# Altium footprint library LukaLIBRARY.PcbLib: 772 footprints (part 23 of 49)
Each footprint in its own frame and in the unit in brackets; x right, y up, seen from the top. Pads: shape width x height; smd on the part's side, far side on the other; paste and mask are expansions set on the pad; w line width, h text height; cw(c..) or ccw(c..) is an arc to the next point about the centre after c.
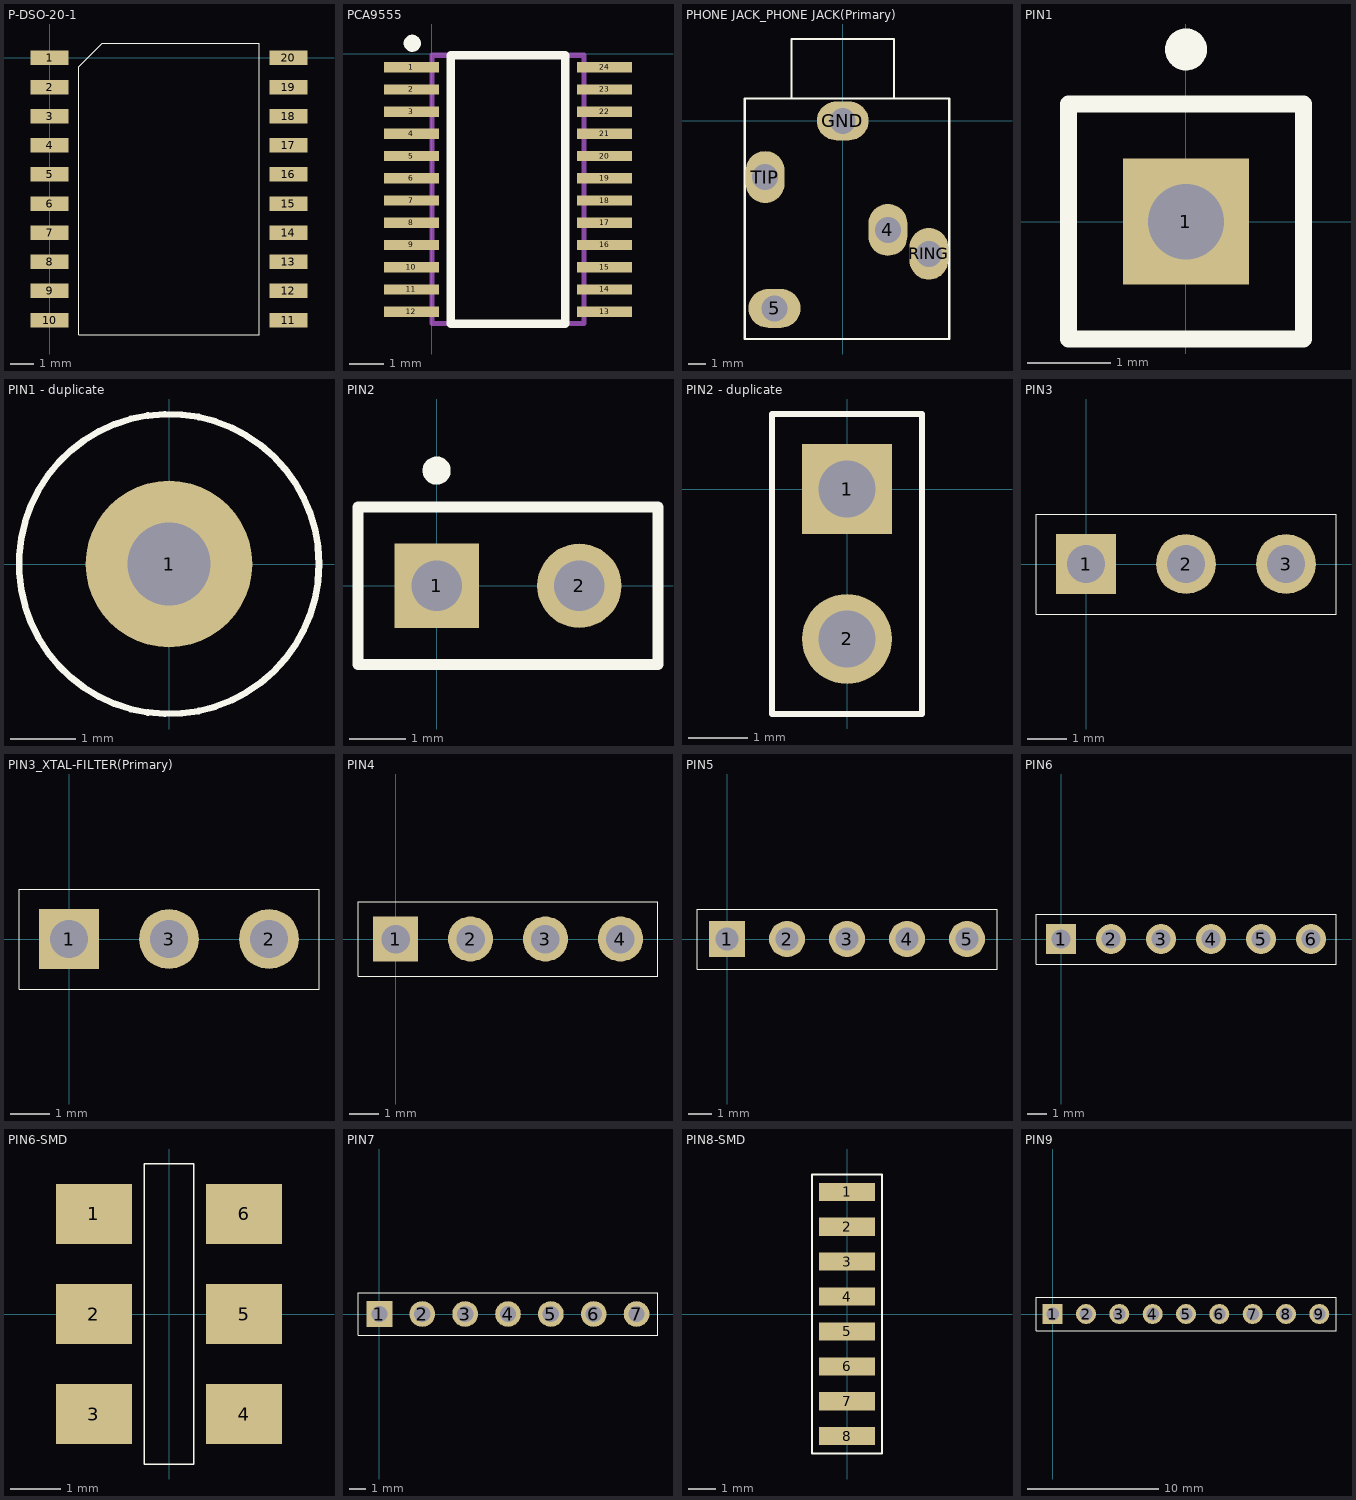
[diagram p22: the footprints below, top view; thin cyan lines are the x and y axes]

## P-DSO-20-1 [mil]
pads (20):
  rect 65x25 smd: 1(0,0) 2(0,-50) 3(0,-100) 4(0,-150) 5(0,-200) 6(0,-250) 7(0,-300) 8(0,-350) 9(0,-400) 10(0,-450) 11(410,-450) 12(410,-400) 13(410,-350) 14(410,-300) 15(410,-250) 16(410,-200) 17(410,-150) 18(410,-100) 19(410,-50) 20(410,0)
Top Overlay:
  lines w1: 50,-475 360,-475 360,25 90,25 50,-15 50,-475

## PCA9555 [mm] "I2C I/O Ports PW Package"
pads (24):
  rect 1.6x0.3 smd: 1(-0.6,-0.4) 2(-0.6,-1.05) 3(-0.6,-1.7) 4(-0.6,-2.35) 5(-0.6,-3) 6(-0.6,-3.65) 7(-0.6,-4.3) 8(-0.6,-4.95) 9(-0.6,-5.6) 10(-0.6,-6.25) 11(-0.6,-6.9) 12(-0.6,-7.55) 13(5.05,-7.55) 14(5.05,-6.9) 15(5.05,-6.25) 16(5.05,-5.6) 17(5.05,-4.95) 18(5.05,-4.3) 19(5.05,-3.65) 20(5.05,-3) 21(5.05,-2.35) 22(5.05,-1.7) 23(5.05,-1.05) 24(5.05,-0.4)
Top Overlay:
  circle w0.25: c-0.575,0.3 r0.125
  lines w0.254: 0.55,-7.9 0.55,-0.05 3.9,-0.05 3.9,-7.9 0.55,-7.9
Mechanical 1:
  lines w0.15: 0,-7.9 0,-0.05 4.45,-0.05 4.45,-7.9 0,-7.9

## PHONE JACK_PHONE JACK(Primary) [mil]
pads (5):
  oval 90x120 hole 60: 4(104.33,-251.97) RING(198.82,-307.09) TIP(-179.13,-129.92)
  oval 120x90 hole 60: 5(-157.48,-433.07) GND(0,0)
Top Overlay:
  lines w5: -118.11,51.18 -118.11,188.98 118.11,188.98 118.11,51.18 ; -226.38,-503.94 246.06,-503.94 246.06,51.18 -226.38,51.18 -226.38,-503.94

## PIN1 [mm] "Generic Antenna; 1 Lead"
pads (1):
  rect 1.5x1.5 hole 0.9: 1(0,0)
Top Overlay:
  circle w0.25: c0,2.05 r0.125
  lines w0.2: -1.4,-1.4 -1.4,1.4 1.4,1.4 1.4,-1.4 -1.4,-1.4

## PIN1 - duplicate [mm]
pads (1):
  round 2.54 hole 1.27 mask-25.4: 1(0,0)
Top Overlay:
  circle w0.1: c0,0 r2.286
Top Solder:
  region: 0,1.281 -0.332,1.237 -0.64,1.109 -0.906,0.906 -1.109,0.64 -1.237,0.332 -1.281,0 -1.237,-0.332 -1.109,-0.64 -0.906,-0.906 -0.64,-1.109 -0.332,-1.237 0,-1.281 0.332,-1.237 0.64,-1.109 0.906,-0.906 1.109,-0.64 1.237,-0.332 1.281,0 1.237,0.332 1.109,0.64 0.906,0.906 0.64,1.109 0.332,1.237
Bottom Solder:
  region: 0,1.281 -0.332,1.237 -0.64,1.109 -0.906,0.906 -1.109,0.64 -1.237,0.332 -1.281,0 -1.237,-0.332 -1.109,-0.64 -0.906,-0.906 -0.64,-1.109 -0.332,-1.237 0,-1.281 0.332,-1.237 0.64,-1.109 0.906,-0.906 1.109,-0.64 1.237,-0.332 1.281,0 1.237,0.332 1.109,0.64 0.906,0.906 0.64,1.109 0.332,1.237

## PIN2 [mm] "Photosensitive Diode; 2 Leads"
pads (2):
  rect 1.5x1.5 hole 0.9: 1(0,0)
  round 1.5 hole 0.9: 2(2.54,0)
Top Overlay:
  circle w0.25: c0,2.05 r0.125
  lines w0.2: -1.4,-1.4 -1.4,1.4 3.94,1.4 3.94,-1.4 -1.4,-1.4

## PIN2 - duplicate [mil]
pads (2):
  rect 60x60 hole 38 mask-1000: 1(0,0)
  round 60 hole 38 mask-1000: 2(0,-100)
Top Overlay:
  lines w3.94: -50,-150 -50,50 50,50 50,-150 -50,-150
Top Solder:
  region: 0,-69.74 -7.83,-70.77 -15.13,-73.8 -21.4,-78.6 -26.2,-84.87 -29.23,-92.17 -30.26,-100 -29.23,-107.83 -26.2,-115.13 -21.4,-121.4 -15.13,-126.2 -7.83,-129.23 0,-130.26 7.83,-129.23 15.13,-126.2 21.4,-121.4 26.2,-115.13 29.23,-107.83 30.26,-100 29.23,-92.17 26.2,-84.87 21.4,-78.6 15.13,-73.8 7.83,-70.77
  region: -30,-30 30,-30 30,30 -30,30
Bottom Solder:
  region: 0,-69.74 -7.83,-70.77 -15.13,-73.8 -21.4,-78.6 -26.2,-84.87 -29.23,-92.17 -30.26,-100 -29.23,-107.83 -26.2,-115.13 -21.4,-121.4 -15.13,-126.2 -7.83,-129.23 0,-130.26 7.83,-129.23 15.13,-126.2 21.4,-121.4 26.2,-115.13 29.23,-107.83 30.26,-100 29.23,-92.17 26.2,-84.87 21.4,-78.6 15.13,-73.8 7.83,-70.77
  region: -30,-30 30,-30 30,30 -30,30

## PIN3 [mil]
pads (3):
  rect 60x60 hole 38 mask-1000: 1(0,0)
  round 60 hole 38 mask-1000: 2(100,0) 3(200,0)
Top Overlay:
  lines w1: -50,-50 250,-50 250,50 -50,50 -50,-50
Top Solder:
  region: -30,-30 30,-30 30,30 -30,30
  region: 100,30.26 92.17,29.23 84.87,26.2 78.6,21.4 73.8,15.13 70.77,7.83 69.74,0 70.77,-7.83 73.8,-15.13 78.6,-21.4 84.87,-26.2 92.17,-29.23 100,-30.26 107.83,-29.23 115.13,-26.2 121.4,-21.4 126.2,-15.13 129.23,-7.83 130.26,0 129.23,7.83 126.2,15.13 121.4,21.4 115.13,26.2 107.83,29.23
  region: 200,30.26 192.17,29.23 184.87,26.2 178.6,21.4 173.79,15.13 170.77,7.83 169.74,0 170.77,-7.83 173.79,-15.13 178.6,-21.4 184.87,-26.2 192.17,-29.23 200,-30.26 207.83,-29.23 215.13,-26.2 221.4,-21.4 226.21,-15.13 229.23,-7.83 230.26,0 229.23,7.83 226.21,15.13 221.4,21.4 215.13,26.2 207.83,29.23
Bottom Solder:
  region: -30,-30 30,-30 30,30 -30,30
  region: 100,30.26 92.17,29.23 84.87,26.2 78.6,21.4 73.8,15.13 70.77,7.83 69.74,0 70.77,-7.83 73.8,-15.13 78.6,-21.4 84.87,-26.2 92.17,-29.23 100,-30.26 107.83,-29.23 115.13,-26.2 121.4,-21.4 126.2,-15.13 129.23,-7.83 130.26,0 129.23,7.83 126.2,15.13 121.4,21.4 115.13,26.2 107.83,29.23
  region: 200,30.26 192.17,29.23 184.87,26.2 178.6,21.4 173.79,15.13 170.77,7.83 169.74,0 170.77,-7.83 173.79,-15.13 178.6,-21.4 184.87,-26.2 192.17,-29.23 200,-30.26 207.83,-29.23 215.13,-26.2 221.4,-21.4 226.21,-15.13 229.23,-7.83 230.26,0 229.23,7.83 226.21,15.13 221.4,21.4 215.13,26.2 207.83,29.23

## PIN3_XTAL-FILTER(Primary) [mil]
pads (3):
  rect 60x60 hole 38 mask-1000: 1(0,0)
  round 60 hole 38 mask-1000: 2(200,0) 3(100,0)
Top Overlay:
  lines w1: -50,-50 -50,50 250,50 250,-50 -50,-50
Top Solder:
  region: 200,30.26 192.17,29.23 184.87,26.2 178.6,21.4 173.79,15.13 170.77,7.83 169.74,0 170.77,-7.83 173.79,-15.13 178.6,-21.4 184.87,-26.2 192.17,-29.23 200,-30.26 207.83,-29.23 215.13,-26.2 221.4,-21.4 226.21,-15.13 229.23,-7.83 230.26,0 229.23,7.83 226.21,15.13 221.4,21.4 215.13,26.2 207.83,29.23
  region: 100,30.26 92.17,29.23 84.87,26.2 78.6,21.4 73.8,15.13 70.77,7.83 69.74,0 70.77,-7.83 73.8,-15.13 78.6,-21.4 84.87,-26.2 92.17,-29.23 100,-30.26 107.83,-29.23 115.13,-26.2 121.4,-21.4 126.2,-15.13 129.23,-7.83 130.26,0 129.23,7.83 126.2,15.13 121.4,21.4 115.13,26.2 107.83,29.23
  region: -30,-30 30,-30 30,30 -30,30
Bottom Solder:
  region: 200,30.26 192.17,29.23 184.87,26.2 178.6,21.4 173.79,15.13 170.77,7.83 169.74,0 170.77,-7.83 173.79,-15.13 178.6,-21.4 184.87,-26.2 192.17,-29.23 200,-30.26 207.83,-29.23 215.13,-26.2 221.4,-21.4 226.21,-15.13 229.23,-7.83 230.26,0 229.23,7.83 226.21,15.13 221.4,21.4 215.13,26.2 207.83,29.23
  region: 100,30.26 92.17,29.23 84.87,26.2 78.6,21.4 73.8,15.13 70.77,7.83 69.74,0 70.77,-7.83 73.8,-15.13 78.6,-21.4 84.87,-26.2 92.17,-29.23 100,-30.26 107.83,-29.23 115.13,-26.2 121.4,-21.4 126.2,-15.13 129.23,-7.83 130.26,0 129.23,7.83 126.2,15.13 121.4,21.4 115.13,26.2 107.83,29.23
  region: -30,-30 30,-30 30,30 -30,30

## PIN4 [mil]
pads (4):
  rect 60x60 hole 38 mask-1000: 1(0,0)
  round 60 hole 38 mask-1000: 2(100,0) 3(200,0) 4(300,0)
Top Overlay:
  lines w1: -50,-50 350,-50 350,50 -50,50 -50,-50
Top Solder:
  region: 300,30.26 292.17,29.23 284.87,26.2 278.6,21.4 273.8,15.13 270.77,7.83 269.74,0 270.77,-7.83 273.8,-15.13 278.6,-21.4 284.87,-26.2 292.17,-29.23 300,-30.26 307.83,-29.23 315.13,-26.2 321.4,-21.4 326.2,-15.13 329.23,-7.83 330.26,0 329.23,7.83 326.2,15.13 321.4,21.4 315.13,26.2 307.83,29.23
  region: -30,-30 30,-30 30,30 -30,30
  region: 100,30.26 92.17,29.23 84.87,26.2 78.6,21.4 73.8,15.13 70.77,7.83 69.74,0 70.77,-7.83 73.8,-15.13 78.6,-21.4 84.87,-26.2 92.17,-29.23 100,-30.26 107.83,-29.23 115.13,-26.2 121.4,-21.4 126.2,-15.13 129.23,-7.83 130.26,0 129.23,7.83 126.2,15.13 121.4,21.4 115.13,26.2 107.83,29.23
  region: 200,30.26 192.17,29.23 184.87,26.2 178.6,21.4 173.79,15.13 170.77,7.83 169.74,0 170.77,-7.83 173.79,-15.13 178.6,-21.4 184.87,-26.2 192.17,-29.23 200,-30.26 207.83,-29.23 215.13,-26.2 221.4,-21.4 226.21,-15.13 229.23,-7.83 230.26,0 229.23,7.83 226.21,15.13 221.4,21.4 215.13,26.2 207.83,29.23
Bottom Solder:
  region: 300,30.26 292.17,29.23 284.87,26.2 278.6,21.4 273.8,15.13 270.77,7.83 269.74,0 270.77,-7.83 273.8,-15.13 278.6,-21.4 284.87,-26.2 292.17,-29.23 300,-30.26 307.83,-29.23 315.13,-26.2 321.4,-21.4 326.2,-15.13 329.23,-7.83 330.26,0 329.23,7.83 326.2,15.13 321.4,21.4 315.13,26.2 307.83,29.23
  region: -30,-30 30,-30 30,30 -30,30
  region: 100,30.26 92.17,29.23 84.87,26.2 78.6,21.4 73.8,15.13 70.77,7.83 69.74,0 70.77,-7.83 73.8,-15.13 78.6,-21.4 84.87,-26.2 92.17,-29.23 100,-30.26 107.83,-29.23 115.13,-26.2 121.4,-21.4 126.2,-15.13 129.23,-7.83 130.26,0 129.23,7.83 126.2,15.13 121.4,21.4 115.13,26.2 107.83,29.23
  region: 200,30.26 192.17,29.23 184.87,26.2 178.6,21.4 173.79,15.13 170.77,7.83 169.74,0 170.77,-7.83 173.79,-15.13 178.6,-21.4 184.87,-26.2 192.17,-29.23 200,-30.26 207.83,-29.23 215.13,-26.2 221.4,-21.4 226.21,-15.13 229.23,-7.83 230.26,0 229.23,7.83 226.21,15.13 221.4,21.4 215.13,26.2 207.83,29.23

## PIN5 [mil]
pads (5):
  rect 60x60 hole 38 mask-1000: 1(0,0)
  round 60 hole 38 mask-1000: 2(100,0) 3(200,0) 4(300,0) 5(400,0)
Top Overlay:
  lines w1: -50,-50 450,-50 450,50 -50,50 -50,-50
Top Solder:
  region: 300,30.26 292.17,29.23 284.87,26.2 278.6,21.4 273.8,15.13 270.77,7.83 269.74,0 270.77,-7.83 273.8,-15.13 278.6,-21.4 284.87,-26.2 292.17,-29.23 300,-30.26 307.83,-29.23 315.13,-26.2 321.4,-21.4 326.2,-15.13 329.23,-7.83 330.26,0 329.23,7.83 326.2,15.13 321.4,21.4 315.13,26.2 307.83,29.23
  region: -30,-30 30,-30 30,30 -30,30
  region: 400,30.26 392.17,29.23 384.87,26.2 378.6,21.4 373.8,15.13 370.77,7.83 369.74,0 370.77,-7.83 373.8,-15.13 378.6,-21.4 384.87,-26.2 392.17,-29.23 400,-30.26 407.83,-29.23 415.13,-26.2 421.4,-21.4 426.2,-15.13 429.23,-7.83 430.26,0 429.23,7.83 426.2,15.13 421.4,21.4 415.13,26.2 407.83,29.23
  region: 100,30.26 92.17,29.23 84.87,26.2 78.6,21.4 73.8,15.13 70.77,7.83 69.74,0 70.77,-7.83 73.8,-15.13 78.6,-21.4 84.87,-26.2 92.17,-29.23 100,-30.26 107.83,-29.23 115.13,-26.2 121.4,-21.4 126.2,-15.13 129.23,-7.83 130.26,0 129.23,7.83 126.2,15.13 121.4,21.4 115.13,26.2 107.83,29.23
  region: 200,30.26 192.17,29.23 184.87,26.2 178.6,21.4 173.79,15.13 170.77,7.83 169.74,0 170.77,-7.83 173.79,-15.13 178.6,-21.4 184.87,-26.2 192.17,-29.23 200,-30.26 207.83,-29.23 215.13,-26.2 221.4,-21.4 226.21,-15.13 229.23,-7.83 230.26,0 229.23,7.83 226.21,15.13 221.4,21.4 215.13,26.2 207.83,29.23
Bottom Solder:
  region: 300,30.26 292.17,29.23 284.87,26.2 278.6,21.4 273.8,15.13 270.77,7.83 269.74,0 270.77,-7.83 273.8,-15.13 278.6,-21.4 284.87,-26.2 292.17,-29.23 300,-30.26 307.83,-29.23 315.13,-26.2 321.4,-21.4 326.2,-15.13 329.23,-7.83 330.26,0 329.23,7.83 326.2,15.13 321.4,21.4 315.13,26.2 307.83,29.23
  region: -30,-30 30,-30 30,30 -30,30
  region: 400,30.26 392.17,29.23 384.87,26.2 378.6,21.4 373.8,15.13 370.77,7.83 369.74,0 370.77,-7.83 373.8,-15.13 378.6,-21.4 384.87,-26.2 392.17,-29.23 400,-30.26 407.83,-29.23 415.13,-26.2 421.4,-21.4 426.2,-15.13 429.23,-7.83 430.26,0 429.23,7.83 426.2,15.13 421.4,21.4 415.13,26.2 407.83,29.23
  region: 100,30.26 92.17,29.23 84.87,26.2 78.6,21.4 73.8,15.13 70.77,7.83 69.74,0 70.77,-7.83 73.8,-15.13 78.6,-21.4 84.87,-26.2 92.17,-29.23 100,-30.26 107.83,-29.23 115.13,-26.2 121.4,-21.4 126.2,-15.13 129.23,-7.83 130.26,0 129.23,7.83 126.2,15.13 121.4,21.4 115.13,26.2 107.83,29.23
  region: 200,30.26 192.17,29.23 184.87,26.2 178.6,21.4 173.79,15.13 170.77,7.83 169.74,0 170.77,-7.83 173.79,-15.13 178.6,-21.4 184.87,-26.2 192.17,-29.23 200,-30.26 207.83,-29.23 215.13,-26.2 221.4,-21.4 226.21,-15.13 229.23,-7.83 230.26,0 229.23,7.83 226.21,15.13 221.4,21.4 215.13,26.2 207.83,29.23

## PIN6 [mil]
pads (6):
  rect 60x60 hole 38 mask-1000: 1(0,0)
  round 60 hole 38 mask-1000: 2(100,0) 3(200,0) 4(300,0) 5(400,0) 6(500,0)
Top Overlay:
  lines w1: -50,-50 -50,50 550,50 550,-50 -50,-50
Top Solder:
  region: 200,30.26 192.17,29.23 184.87,26.2 178.6,21.4 173.79,15.13 170.77,7.83 169.74,0 170.77,-7.83 173.79,-15.13 178.6,-21.4 184.87,-26.2 192.17,-29.23 200,-30.26 207.83,-29.23 215.13,-26.2 221.4,-21.4 226.21,-15.13 229.23,-7.83 230.26,0 229.23,7.83 226.21,15.13 221.4,21.4 215.13,26.2 207.83,29.23
  region: 100,30.26 92.17,29.23 84.87,26.2 78.6,21.4 73.8,15.13 70.77,7.83 69.74,0 70.77,-7.83 73.8,-15.13 78.6,-21.4 84.87,-26.2 92.17,-29.23 100,-30.26 107.83,-29.23 115.13,-26.2 121.4,-21.4 126.2,-15.13 129.23,-7.83 130.26,0 129.23,7.83 126.2,15.13 121.4,21.4 115.13,26.2 107.83,29.23
  region: 500,30.26 492.17,29.23 484.87,26.2 478.6,21.4 473.8,15.13 470.77,7.83 469.74,0 470.77,-7.83 473.8,-15.13 478.6,-21.4 484.87,-26.2 492.17,-29.23 500,-30.26 507.83,-29.23 515.13,-26.2 521.4,-21.4 526.21,-15.13 529.23,-7.83 530.26,0 529.23,7.83 526.21,15.13 521.4,21.4 515.13,26.2 507.83,29.23
  region: 400,30.26 392.17,29.23 384.87,26.2 378.6,21.4 373.8,15.13 370.77,7.83 369.74,0 370.77,-7.83 373.8,-15.13 378.6,-21.4 384.87,-26.2 392.17,-29.23 400,-30.26 407.83,-29.23 415.13,-26.2 421.4,-21.4 426.2,-15.13 429.23,-7.83 430.26,0 429.23,7.83 426.2,15.13 421.4,21.4 415.13,26.2 407.83,29.23
  region: -30,-30 30,-30 30,30 -30,30
  region: 300,30.26 292.17,29.23 284.87,26.2 278.6,21.4 273.8,15.13 270.77,7.83 269.74,0 270.77,-7.83 273.8,-15.13 278.6,-21.4 284.87,-26.2 292.17,-29.23 300,-30.26 307.83,-29.23 315.13,-26.2 321.4,-21.4 326.2,-15.13 329.23,-7.83 330.26,0 329.23,7.83 326.2,15.13 321.4,21.4 315.13,26.2 307.83,29.23
Bottom Solder:
  region: 200,30.26 192.17,29.23 184.87,26.2 178.6,21.4 173.79,15.13 170.77,7.83 169.74,0 170.77,-7.83 173.79,-15.13 178.6,-21.4 184.87,-26.2 192.17,-29.23 200,-30.26 207.83,-29.23 215.13,-26.2 221.4,-21.4 226.21,-15.13 229.23,-7.83 230.26,0 229.23,7.83 226.21,15.13 221.4,21.4 215.13,26.2 207.83,29.23
  region: 100,30.26 92.17,29.23 84.87,26.2 78.6,21.4 73.8,15.13 70.77,7.83 69.74,0 70.77,-7.83 73.8,-15.13 78.6,-21.4 84.87,-26.2 92.17,-29.23 100,-30.26 107.83,-29.23 115.13,-26.2 121.4,-21.4 126.2,-15.13 129.23,-7.83 130.26,0 129.23,7.83 126.2,15.13 121.4,21.4 115.13,26.2 107.83,29.23
  region: 500,30.26 492.17,29.23 484.87,26.2 478.6,21.4 473.8,15.13 470.77,7.83 469.74,0 470.77,-7.83 473.8,-15.13 478.6,-21.4 484.87,-26.2 492.17,-29.23 500,-30.26 507.83,-29.23 515.13,-26.2 521.4,-21.4 526.21,-15.13 529.23,-7.83 530.26,0 529.23,7.83 526.21,15.13 521.4,21.4 515.13,26.2 507.83,29.23
  region: 400,30.26 392.17,29.23 384.87,26.2 378.6,21.4 373.8,15.13 370.77,7.83 369.74,0 370.77,-7.83 373.8,-15.13 378.6,-21.4 384.87,-26.2 392.17,-29.23 400,-30.26 407.83,-29.23 415.13,-26.2 421.4,-21.4 426.2,-15.13 429.23,-7.83 430.26,0 429.23,7.83 426.2,15.13 421.4,21.4 415.13,26.2 407.83,29.23
  region: -30,-30 30,-30 30,30 -30,30
  region: 300,30.26 292.17,29.23 284.87,26.2 278.6,21.4 273.8,15.13 270.77,7.83 269.74,0 270.77,-7.83 273.8,-15.13 278.6,-21.4 284.87,-26.2 292.17,-29.23 300,-30.26 307.83,-29.23 315.13,-26.2 321.4,-21.4 326.2,-15.13 329.23,-7.83 330.26,0 329.23,7.83 326.2,15.13 321.4,21.4 315.13,26.2 307.83,29.23

## PIN6-SMD [mm]
pads (6):
  rect 1.524x1.2 smd mask-25.4: 1(-1.5,2) 2(-1.5,0) 3(-1.5,-2) 4(1.5,-2) 5(1.5,0) 6(1.5,2)
Top Overlay:
  lines w0.025: -0.5,-3 -0.5,3 0.5,3 0.5,-3 -0.5,-3
Top Solder:
  region: 0.738,1.238 2.262,1.238 2.262,2.762 0.738,2.762
  region: -2.262,1.238 -0.738,1.238 -0.738,2.762 -2.262,2.762
  region: 0.738,-0.762 2.262,-0.762 2.262,0.762 0.738,0.762
  region: 0.738,-2.762 2.262,-2.762 2.262,-1.238 0.738,-1.238
  region: -2.262,-2.762 -0.738,-2.762 -0.738,-1.238 -2.262,-1.238
  region: -2.262,-0.762 -0.738,-0.762 -0.738,0.762 -2.262,0.762

## PIN7 [mil]
pads (7):
  rect 60x60 hole 38 mask-1000: 1(0,0)
  round 60 hole 38 mask-1000: 2(100,0) 3(200,0) 4(300,0) 5(400,0) 6(500,0) 7(600,0)
Top Overlay:
  lines w1: -50,-50 -50,50 650,50 650,-50 -50,-50
Top Solder:
  drawing of 7 lines, arcs and shapes, not listed
Bottom Solder:
  drawing of 7 lines, arcs and shapes, not listed

## PIN8-SMD [mil]
pads (8):
  rect 80x26 smd mask-1000: 1(0,175) 2(0,125) 3(0,75) 4(0,25) 5(0,-25) 6(0,-75) 7(0,-125) 8(0,-175)
Top Overlay:
  lines w3: -50,-200 50,-200 50,200 -50,200 -50,-200
Top Solder:
  region: -40,-88 40,-88 40,-62 -40,-62
  region: -40,-138 40,-138 40,-112 -40,-112
  region: -40,-188 40,-188 40,-162 -40,-162
  region: -40,12 40,12 40,38 -40,38
  region: -40,-38 40,-38 40,-12 -40,-12
  region: -40,162 40,162 40,188 -40,188
  region: -40,112 40,112 40,138 -40,138
  region: -40,62 40,62 40,88 -40,88

## PIN9 [mil]
pads (9):
  rect 60x60 hole 38 mask-1000: 1(0,0)
  round 60 hole 38 mask-1000: 2(100,0) 3(200,0) 4(300,0) 5(400,0) 6(500,0) 7(600,0) 8(700,0) 9(800,0)
Top Overlay:
  lines w1: -50,-50 -50,50 850,50 850,-50 -50,-50
Top Solder:
  drawing of 9 lines, arcs and shapes, not listed
Bottom Solder:
  drawing of 9 lines, arcs and shapes, not listed